# Altium footprint library Basal.PcbLib: 248 footprints (part 4 of 16)
Each footprint in its own frame and in the unit in brackets; x right, y up, seen from the top. Pads: shape width x height; smd on the part's side, far side on the other; paste and mask are expansions set on the pad; w line width, h text height; cw(c..) or ccw(c..) is an arc to the next point about the centre after c.
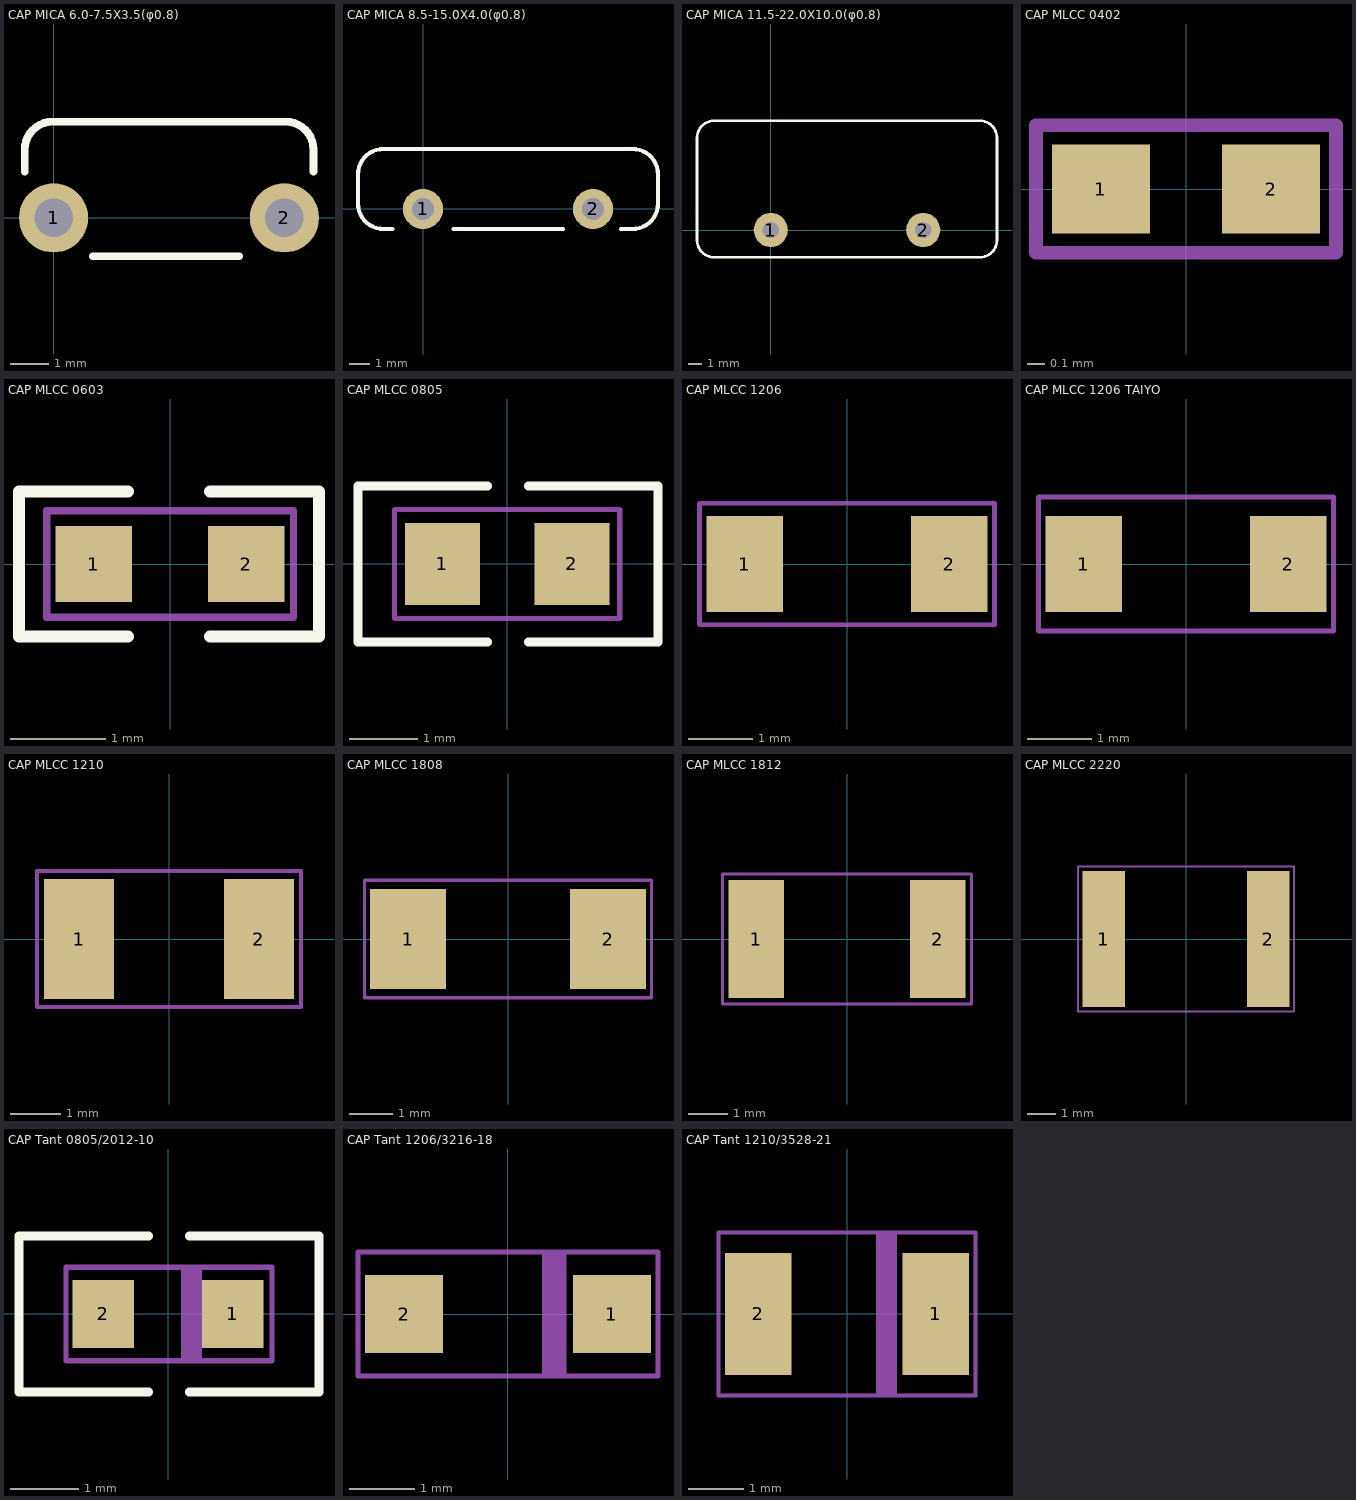
[diagram p3: the footprints below, top view; thin cyan lines are the x and y axes]

## CAP MICA 6.0-7.5X3.5(φ0.8) [mm]
pads (2):
  round 1.8 hole 1: 1(0,0) 2(6,0)
Top Overlay:
  lines w0.203: -0.75,1.207 -0.75,1.778 cw(c-0.028,1.778) -0.028,2.5 5.436,2.5 5.672,2.5 ; 1.016,-1 4.826,-1 ; 5.283,2.5 6.034,2.5 cw(c6.034,1.778) 6.756,1.778 6.756,1.207

## CAP MICA 8.5-15.0X4.0(φ0.8) [mm]
pads (2):
  round 2 hole 1.1: 1(0,0) 2(8.5,0)
Top Overlay:
  lines w0.203: -1.778,3 10.48,3 cw(c10.48,1.73) 11.75,1.73 11.75,1.422 11.75,0.27 cw(c10.48,0.27) 10.48,-1 9.906,-1 ; -1.524,-1 -1.98,-1 cw(c-1.98,0.27) -3.25,0.27 -3.25,1.73 cw(c-1.98,1.73) -1.98,3 -1.168,3 ; 1.524,-1 7.01,-1

## CAP MICA 11.5-22.0X10.0(φ0.8) [mm]
pads (2):
  round 2.5 hole 1.2: 1(0,0) 2(11.15,0)
Top Overlay:
  lines w0.203: 16.55,1.27 16.55,6.73 ccw(c15.28,6.73) 15.28,8 -4.13,8 ccw(c-4.13,6.73) -5.4,6.73 -5.4,-0.73 ccw(c-4.13,-0.73) -4.13,-2 15.28,-2 ccw(c15.28,-0.73) 16.55,-0.73 16.55,3.658

## CAP MLCC 0402 [mm] "贴片无极性电容0402封装"
height 0.3
pads (2):
  rect 0.55x0.5 smd: 1(-0.475,0) 2(0.475,0)
Mechanical 15:
  lines w0.076: -0.838,-0.356 -0.838,0.356 0.838,0.356 0.838,-0.356 -0.838,-0.356
3D body "C0402_1.STEP": height 0.55, standoff 0, extent -0.525,-0.275 0.525,0.275

## CAP MLCC 0603 [mm] "贴片无极性电容0603封装"
height 0.4
pads (2):
  rect 0.8x0.8 smd paste-1: 1(-0.8,0) 2(0.8,0)
Top Overlay:
  lines w0.127: -0.443,-0.762 -1.586,-0.762 -1.586,0.762 -0.443,0.762 ; 0.421,-0.762 1.564,-0.762 1.564,0.762 0.421,0.762
Top Paste:
  region: 0.419,0.15 0.719,0.368 1.169,0.368 1.169,-0.368 0.719,-0.368 0.419,-0.15
  region: -0.419,-0.15 -0.719,-0.368 -1.169,-0.368 -1.169,0.368 -0.719,0.368 -0.419,0.15
Mechanical 15:
  lines w0.076: -1.295,-0.559 1.295,-0.559 1.295,0.559 -1.295,0.559 -1.295,-0.559
3D body "cap_0603-1.STEP": height 0.8, standoff 0, extent -0.8,-0.4 0.8,0.4

## CAP MLCC 0805 [mm] "贴片无极性电容0805封装"
height 0.5
pads (2):
  rect 1.1x1.2 smd paste-2: 1(-0.95,0) 2(0.95,0)
Top Overlay:
  lines w0.127: -0.282,-1.143 -2.187,-1.143 -2.187,1.143 -0.282,1.143 ; 0.307,-1.143 2.212,-1.143 2.212,1.143 0.307,1.143
Top Paste:
  region: -0.452,-0.459 -0.452,-0.479 -0.467,-0.515 -0.496,-0.544 -0.532,-0.559 -0.552,-0.559 -1.348,-0.559 -1.368,-0.559 -1.404,-0.544 -1.433,-0.515 -1.448,-0.479 -1.448,-0.459 -1.448,0.459 -1.448,0.479 -1.433,0.515 -1.404,0.544 -1.368,0.559 -1.348,0.559 -0.552,0.559 -0.532,0.559 -0.496,0.544 -0.467,0.515 -0.452,0.479 -0.452,0.459 -0.452,0.3 -0.452,0.28 -0.467,0.243 -0.496,0.215 -0.532,0.2 -0.552,0.2 -0.648,0.2 -0.687,0.196 -0.759,0.166 -0.814,0.111 -0.844,0.039 -0.844,-0.039 -0.814,-0.111 -0.759,-0.166 -0.687,-0.196 -0.648,-0.2 -0.552,-0.2 -0.532,-0.2 -0.496,-0.215 -0.467,-0.243 -0.452,-0.28 -0.452,-0.3
  region: 0.452,0.459 0.452,0.479 0.467,0.515 0.496,0.544 0.532,0.559 0.552,0.559 1.348,0.559 1.368,0.559 1.404,0.544 1.433,0.515 1.448,0.479 1.448,0.459 1.448,-0.459 1.448,-0.479 1.433,-0.515 1.404,-0.544 1.368,-0.559 1.348,-0.559 0.552,-0.559 0.532,-0.559 0.496,-0.544 0.467,-0.515 0.452,-0.479 0.452,-0.459 0.452,-0.3 0.452,-0.28 0.467,-0.243 0.496,-0.215 0.532,-0.2 0.552,-0.2 0.648,-0.2 0.687,-0.196 0.759,-0.166 0.814,-0.111 0.844,-0.039 0.844,0.039 0.814,0.111 0.759,0.166 0.687,0.196 0.648,0.2 0.552,0.2 0.532,0.2 0.496,0.215 0.467,0.243 0.452,0.28 0.452,0.3
Mechanical 15:
  lines w0.076: -1.651,-0.8 1.651,-0.8 1.651,0.8 -1.651,0.8 -1.651,-0.8
3D body "cap_0805-1.STEP": height 1.2, standoff 0, extent -1,-0.6 1,0.6

## CAP MLCC 1206 [mm] "贴片无极性电容1206封装"
height 0.55
pads (2):
  rect 1.2x1.5 smd paste-3: 1(-1.6,0) 2(1.6,0)
Top Paste:
  region: 1.051,0.611 1.051,0.631 1.066,0.668 1.094,0.696 1.131,0.711 1.151,0.711 2.049,0.711 2.069,0.711 2.106,0.696 2.134,0.668 2.149,0.631 2.149,0.611 2.149,-0.611 2.149,-0.631 2.134,-0.668 2.106,-0.696 2.069,-0.711 2.049,-0.711 1.151,-0.711 1.131,-0.711 1.094,-0.696 1.066,-0.668 1.051,-0.631 1.051,-0.611 1.051,-0.35 1.051,-0.33 1.066,-0.293 1.094,-0.265 1.131,-0.25 1.151,-0.25 1.25,-0.25 1.299,-0.245 1.389,-0.208 1.458,-0.139 1.495,-0.049 1.495,0.049 1.458,0.139 1.389,0.208 1.299,0.245 1.25,0.25 1.151,0.25 1.131,0.25 1.094,0.265 1.066,0.293 1.051,0.33 1.051,0.35
  region: -1.051,-0.611 -1.051,-0.631 -1.066,-0.668 -1.094,-0.696 -1.131,-0.711 -1.151,-0.711 -2.049,-0.711 -2.069,-0.711 -2.106,-0.696 -2.134,-0.668 -2.149,-0.631 -2.149,-0.611 -2.149,0.611 -2.149,0.631 -2.134,0.668 -2.106,0.696 -2.069,0.711 -2.049,0.711 -1.151,0.711 -1.131,0.711 -1.094,0.696 -1.066,0.668 -1.051,0.631 -1.051,0.611 -1.051,0.35 -1.051,0.33 -1.066,0.293 -1.094,0.265 -1.131,0.25 -1.151,0.25 -1.25,0.25 -1.299,0.245 -1.389,0.208 -1.458,0.139 -1.495,0.049 -1.495,-0.049 -1.458,-0.139 -1.389,-0.208 -1.299,-0.245 -1.25,-0.25 -1.151,-0.25 -1.131,-0.25 -1.094,-0.265 -1.066,-0.293 -1.051,-0.33 -1.051,-0.35
Mechanical 15:
  lines w0.076: -2.311,-0.953 2.311,-0.953 2.311,0.953 -2.311,0.953 -2.311,-0.953
3D body "cap_1206_3.STEP": height 1.7, standoff 0, extent -1.6,-0.85 1.6,0.85

## CAP MLCC 1206 TAIYO [mm] "贴片无极性电容1206封装"
height 0.55
pads (2):
  rect 1.2x1.5 smd paste-3: 1(-1.6,0) 2(1.6,0)
Top Paste:
  region: 1.051,0.611 1.051,0.631 1.066,0.668 1.094,0.696 1.131,0.711 1.151,0.711 2.049,0.711 2.069,0.711 2.106,0.696 2.134,0.668 2.149,0.631 2.149,0.611 2.149,-0.611 2.149,-0.631 2.134,-0.668 2.106,-0.696 2.069,-0.711 2.049,-0.711 1.151,-0.711 1.131,-0.711 1.094,-0.696 1.066,-0.668 1.051,-0.631 1.051,-0.611 1.051,-0.35 1.051,-0.33 1.066,-0.293 1.094,-0.265 1.131,-0.25 1.151,-0.25 1.25,-0.25 1.299,-0.245 1.389,-0.208 1.458,-0.139 1.495,-0.049 1.495,0.049 1.458,0.139 1.389,0.208 1.299,0.245 1.25,0.25 1.151,0.25 1.131,0.25 1.094,0.265 1.066,0.293 1.051,0.33 1.051,0.35
  region: -1.051,-0.611 -1.051,-0.631 -1.066,-0.668 -1.094,-0.696 -1.131,-0.711 -1.151,-0.711 -2.049,-0.711 -2.069,-0.711 -2.106,-0.696 -2.134,-0.668 -2.149,-0.631 -2.149,-0.611 -2.149,0.611 -2.149,0.631 -2.134,0.668 -2.106,0.696 -2.069,0.711 -2.049,0.711 -1.151,0.711 -1.131,0.711 -1.094,0.696 -1.066,0.668 -1.051,0.631 -1.051,0.611 -1.051,0.35 -1.051,0.33 -1.066,0.293 -1.094,0.265 -1.131,0.25 -1.151,0.25 -1.25,0.25 -1.299,0.245 -1.389,0.208 -1.458,0.139 -1.495,0.049 -1.495,-0.049 -1.458,-0.139 -1.389,-0.208 -1.299,-0.245 -1.25,-0.25 -1.151,-0.25 -1.131,-0.25 -1.094,-0.265 -1.066,-0.293 -1.051,-0.33 -1.051,-0.35
Mechanical 15:
  lines w0.076: -2.311,-1.05 -2.311,1.05 2.311,1.05 2.311,-1.05 -2.311,-1.05
3D body "cap_1206_2.stp": height 1.86, standoff 0.06, extent -1.7,-0.9 1.7,0.9

## CAP MLCC 1210 [mm] "贴片无极性电容1210封装"
height 0.5
pads (2):
  rect 1.4x2.4 smd paste-3: 1(-1.8,0) 2(1.8,0)
Top Paste:
  region: 1.157,1.043 1.157,1.063 1.172,1.1 1.2,1.128 1.237,1.143 1.257,1.143 2.343,1.143 2.363,1.143 2.4,1.128 2.428,1.1 2.443,1.063 2.443,1.043 2.443,-1.043 2.443,-1.063 2.428,-1.1 2.4,-1.128 2.363,-1.143 2.343,-1.143 1.257,-1.143 1.237,-1.143 1.2,-1.128 1.172,-1.1 1.157,-1.063 1.157,-1.043 1.157,-0.5 1.157,-0.48 1.172,-0.443 1.2,-0.415 1.237,-0.4 1.257,-0.4 1.335,-0.392 1.479,-0.333 1.59,-0.222 1.649,-0.078 1.649,0.078 1.59,0.222 1.479,0.333 1.335,0.392 1.257,0.4 1.237,0.4 1.2,0.415 1.172,0.443 1.157,0.48 1.157,0.5
  region: -1.157,-1.043 -1.157,-1.063 -1.172,-1.1 -1.2,-1.128 -1.237,-1.143 -1.257,-1.143 -2.343,-1.143 -2.363,-1.143 -2.4,-1.128 -2.428,-1.1 -2.443,-1.063 -2.443,-1.043 -2.443,1.043 -2.443,1.063 -2.428,1.1 -2.4,1.128 -2.363,1.143 -2.343,1.143 -1.257,1.143 -1.237,1.143 -1.2,1.128 -1.172,1.1 -1.157,1.063 -1.157,1.043 -1.157,0.5 -1.157,0.48 -1.172,0.443 -1.2,0.415 -1.237,0.4 -1.257,0.4 -1.335,0.392 -1.479,0.333 -1.59,0.222 -1.649,0.078 -1.649,-0.078 -1.59,-0.222 -1.479,-0.333 -1.335,-0.392 -1.257,-0.4 -1.237,-0.4 -1.2,-0.415 -1.172,-0.443 -1.157,-0.48 -1.157,-0.5
Mechanical 15:
  lines w0.076: -2.642,-1.359 2.642,-1.359 2.642,1.359 -2.642,1.359 -2.642,-1.359
3D body "cap_1210_1.stp": height 2.11, standoff 0.01, extent -1.7,-1.35 1.7,1.35

## CAP MLCC 1808 [mm] "贴片无极性电容1812封装"
height 0.5
pads (2):
  rect 1.75x2.3 smd paste-5: 1(-2.3,0) 2(2.3,0)
Top Paste:
  region: -1.5,-1 -1.5,-1.02 -1.515,-1.057 -1.544,-1.085 -1.58,-1.1 -1.6,-1.1 -3,-1.1 -3.02,-1.1 -3.057,-1.085 -3.085,-1.057 -3.1,-1.02 -3.1,-1 -3.1,1 -3.1,1.02 -3.085,1.057 -3.057,1.085 -3.02,1.1 -3,1.1 -1.6,1.1 -1.58,1.1 -1.543,1.085 -1.515,1.057 -1.5,1.02 -1.5,1 -1.5,0.55 -1.5,0.53 -1.515,0.493 -1.544,0.465 -1.58,0.45 -1.6,0.45 -1.688,0.441 -1.85,0.374 -1.974,0.25 -2.042,0.088 -2.042,-0.088 -1.974,-0.25 -1.85,-0.374 -1.688,-0.441 -1.6,-0.45 -1.58,-0.45 -1.544,-0.465 -1.515,-0.493 -1.5,-0.53 -1.5,-0.55
  region: 1.5,1 1.5,1.02 1.515,1.057 1.544,1.085 1.58,1.1 1.6,1.1 3,1.1 3.02,1.1 3.057,1.085 3.085,1.057 3.1,1.02 3.1,1 3.1,-1 3.1,-1.02 3.085,-1.057 3.057,-1.085 3.02,-1.1 3,-1.1 1.6,-1.1 1.58,-1.1 1.543,-1.085 1.515,-1.057 1.5,-1.02 1.5,-1 1.5,-0.55 1.5,-0.53 1.515,-0.493 1.544,-0.465 1.58,-0.45 1.6,-0.45 1.688,-0.441 1.85,-0.374 1.974,-0.25 2.042,-0.088 2.042,0.088 1.974,0.25 1.85,0.374 1.688,0.441 1.6,0.45 1.58,0.45 1.544,0.465 1.515,0.493 1.5,0.53 1.5,0.55
Mechanical 15:
  lines w0.076: -3.3,-1.35 -3.3,1.35 3.3,1.35 3.3,-1.35 -3.3,-1.35
3D body "C1808.stp": height 2.16, standoff 0.01, extent -2.6,-1.1 2.6,1.1

## CAP MLCC 1812 [mm] "贴片无极性电容1812封装"
height 0.5
pads (2):
  rect 1.4x3 smd: 1(-2.3,0) 2(2.3,0)
Mechanical 15:
  lines w0.076: -3.15,-1.651 3.15,-1.651 3.15,1.651 -3.15,1.651 -3.15,-1.651
3D body "C1812_2.STEP": height 1.6, standoff 0, extent -2.25,-1.6 2.25,1.6

## CAP MLCC 2220 [mm]
pads (2):
  rect 1.5x4.8 smd: 1(-2.9,0) 2(2.9,0)
Mechanical 15:
  lines w0.076: -3.81,-2.565 3.81,-2.565 3.81,2.565 -3.81,2.565 -3.81,-2.565
3D body "C2220_3.STEP": height 2.5, standoff 0, extent -2.85,-2.5 2.85,2.5

## CAP Tant 1Footprint - H [mm]

## CAP Tant 0805/2012-10 [mm] "钽电容N型封装"
height 10
pads (2):
  rect 0.9x1 smd: 1(0.95,0) 2(-0.95,0)
Top Overlay:
  lines w0.127: -0.282,-1.143 -2.187,-1.143 -2.187,1.143 -0.282,1.143 ; 0.307,-1.143 2.212,-1.143 2.212,1.143 0.307,1.143
Mechanical 15:
  lines w0.076: 0.229,-0.686 0.229,0.686 ; 0.305,-0.686 0.305,0.686 ; 0.381,-0.686 0.381,0.686 ; 0.457,-0.686 0.457,0.686 ; -1.499,-0.686 1.524,-0.686 1.524,0.686 -1.499,0.686 -1.499,-0.686
3D body "0805 2012.STEP": height 0.8, standoff 0, extent -1,-0.625 1,0.625

## CAP Tant 1206/3216-18 [mm] "钽电容A型封装"
height 18
pads (2):
  rect 1.2x1.2 smd: 1(1.6,0) 2(-1.6,0)
Mechanical 15:
  lines w0.076: 0.559,-0.953 0.559,0.953 ; 0.635,-0.953 0.635,0.953 ; 0.787,-0.953 0.787,0.953 ; 0.864,-0.953 0.864,0.953 ; -2.311,-0.953 -2.311,0.953 2.311,0.953 2.311,-0.953 -2.311,-0.953 ; 0.711,-0.953 0.711,0.953 0.711,-0.953
3D body "AVX_ACASE.STEP": height 1.71, standoff 0, extent -1.7,-0.84 1.7,0.84

## CAP Tant 1210/3528-21 [mm] "钽电容B型封装"
height 21
pads (2):
  rect 1.2x2.2 smd: 1(1.6,0) 2(-1.6,0)
Mechanical 15:
  lines w0.076: 0.559,-1.465 0.559,1.465 ; 0.635,-1.465 0.635,1.465 ; 0.711,-1.465 0.711,1.465 ; 0.787,-1.465 0.787,1.465 ; 0.864,-1.465 0.864,1.465 ; -2.311,-1.465 -2.311,1.465 2.311,1.465 2.311,-1.465 -2.311,-1.465
3D body "AVX_BCASE.STEP": height 2.03, standoff 0, extent -1.85,-1.465 1.85,1.465